# Altium footprint library 7.Connectors&Battary_holders.PcbLib: 133 footprints (part 8 of 9)
Each footprint in its own frame and in the unit in brackets; x right, y up, seen from the top. Pads: shape width x height; smd on the part's side, far side on the other; paste and mask are expansions set on the pad; w line width, h text height; cw(c..) or ccw(c..) is an arc to the next point about the centre after c.
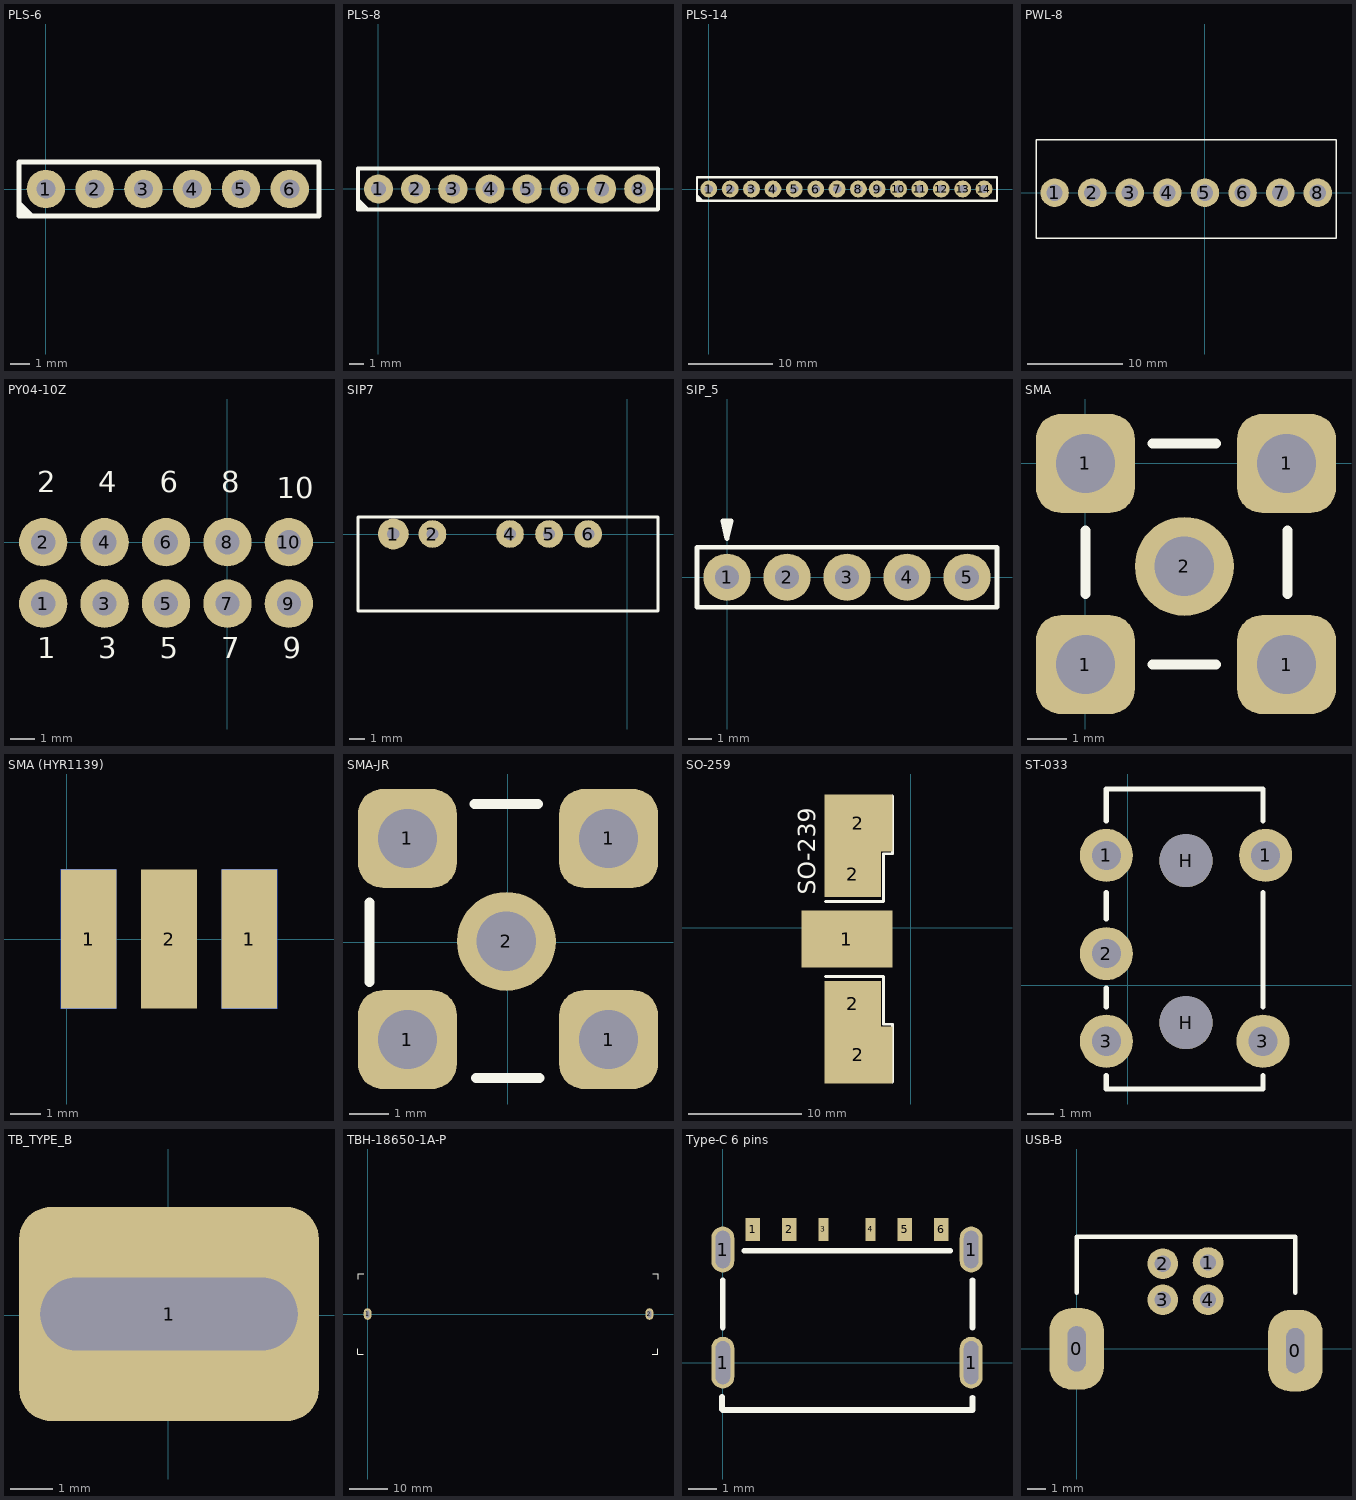
[diagram p7: the footprints below, top view; thin cyan lines are the x and y axes]

## PLS-6 [mm]
pads (6):
  round 2 hole 1: 1(0,0) 2(2.54,0) 3(5.08,0) 4(7.62,0) 5(10.16,0) 6(12.7,0)
Top Overlay:
  lines w0.2: -1.4,-0.7 -0.7,-1.4 -1,-1.4 -1.4,-1 -1.3,-1 -1,-1.3 -0.9,-1.3
  lines w0.254: -1.4,-1.4 14.224,-1.4 14.224,1.4 -1.4,1.4 -1.4,-1.4
3D body "User Library-PLS-5.step": height 8.54, standoff -3, extent -1.2,-1.3 11.5,1.24
3D body "User Library-PLS-5.step": height 8.54, standoff -3, extent 1.34,-1.3 14.04,1.24

## PLS-8 [mm]
pads (8):
  round 2 hole 1: 1(0,0) 2(2.54,0) 3(5.08,0) 4(7.62,0) 5(10.16,0) 6(12.7,0) 7(15.24,0) 8(17.78,0)
Top Overlay:
  lines w0.2: -1.4,-0.7 -0.7,-1.4 -1,-1.4 -1.4,-1 -1.3,-1 -1,-1.3 -0.9,-1.3
  lines w0.254: -1.4,-1.4 -1.4,1.4 19.069,1.4 19.094,1.375 19.094,-1.365 19.059,-1.4 -1.349,-1.4
3D body "User Library-PLS-5.step": height 8.54, standoff -3, extent 6.339,-1.307 19.039,1.233
3D body "User Library-PLS-5.step": height 8.54, standoff -3, extent -1.2,-1.313 11.5,1.227

## PLS-14 [mm]
pads (14):
  round 2 hole 1: 1(0,0) 2(2.54,0) 3(5.08,0) 4(7.62,0) 5(10.16,0) 6(12.7,0) 7(15.24,0) 8(17.78,0) 9(20,0) 10(22.54,0) 11(25.08,0) 12(27.62,0) 13(30.16,0) 14(32.7,0)
Top Overlay:
  lines w0.2: -1.4,-0.7 -0.7,-1.4 -1,-1.4 -1.4,-1 -1.3,-1 -1,-1.3 -0.9,-1.3 ; 19,-1.4 19.3,-1.4
  lines w0.254: 18.6,-1.4 34.246,-1.4 34.246,1.4 18.6,1.4 ; 19.272,-1.4 -1.4,-1.4 -1.4,1.4 19.272,1.4
3D body "User Library-PLS-5.step": height 8.54, standoff -3, extent 8.776,-1.313 21.476,1.227
3D body "User Library-PLS-5.step": height 8.54, standoff -3, extent -1.2,-1.313 11.5,1.227
3D body "User Library-PLS-5.step": height 8.54, standoff -3, extent 21.502,-1.313 34.202,1.227

## PWL-8 [mm]
pads (8):
  round 3 hole 1.7: 1(-15.84,0) 2(-11.88,0) 3(-7.92,0) 4(-3.96,0) 5(0,0) 6(3.96,0) 7(7.92,0) 8(11.88,0)
Top Overlay:
  lines w0.15: -17.8,-4.8 -17.8,5.6 13.8,5.6 13.8,-4.8 -17.8,-4.8
3D body "User Library-PWL-8.step": height 13.8, standoff -3.6, extent -17.8,-4.8 13.88,5.6

## PY04-10Z [mm]
pads (10):
  round 2 hole 1: 1(-7.62,-2.54) 2(-7.62,0) 3(-5.08,-2.54) 4(-5.08,0) 5(-2.54,-2.54) 6(-2.54,0) 7(0,-2.54) 8(0,0) 9(2.54,-2.54) 10(2.54,0)
Top Overlay:
  text "1" at -7.874,-5.08 h1.5
  text "2" at -7.874,1.778 h1.5
  text "10" at 2.032,1.524 h1.5
  text "9" at 2.286,-5.08 h1.5
  text "4" at -5.334,1.778 h1.5
  text "6" at -2.794,1.778 h1.5
  text "8" at -0.254,1.778 h1.5
  text "3" at -5.334,-5.08 h1.5
  text "5" at -2.794,-5.08 h1.5
  text "7" at -0.254,-5.08 h1.5
3D body "User Library-py04-10z.step": height 20, standoff 0, extent -12.032,-21.896 7.968,-6.096

## SIP7 [mm]
pads (5):
  round 2 hole 0.8: 1(-15.2,0)
  round 1.8 hole 0.8: 2(-12.66,0) 4(-7.62,0) 5(-5.08,0) 6(-2.54,0)
Top Overlay:
  lines w0.2: -17.5,-5 -17.5,1.1 2,1.1 2,-5 -17.5,-5
3D body "41356.stp": height 11, standoff -2.4, extent -17.55,-5.05 1.95,1.05

## SIP_5 [mm]
pads (5):
  round 2 hole 1: 1(0,0) 2(2.54,0) 3(5.08,0) 4(7.62,0) 5(10.16,0)
Top Overlay:
  lines w0.2: -0.051,2.311 0,2.007 ; 0,1.626 -0.178,2.388 0.178,2.388 0,1.702 ; -1.27,-1.27 11.43,-1.27 11.43,1.27 -1.27,1.27 -1.27,-1.27
3D body "User Library-SOCKET, SIP5, P2_54MM,  L6MM.step": height 4, standoff -6.2, extent -1.27,-1.27 11.43,1.27

## SMA [mm]
pads (5):
  rrect50% 2.5x2.5 hole 1.5 mask+0.102: 1(0,-5.08) 1(0,0) 1(5.08,-5.08) 1(5.08,0)
  round 2.5 hole 1.5: 2(2.5,-2.6)
Top Overlay:
  lines w0.254: 0,-3.3 0,-1.7 ; 1.7,-5.08 3.3,-5.08 ; 1.7,0.5 3.3,0.5 ; 5.1,-3.3 5.1,-1.7
3D body "User Library-SMA_Stehend_Amp 132134RP-1.STEP": height 9.53, standoff -3.94, extent -1,-6.1 6,0.9

## SMA (HYR1139) [mm]
pads (5):
  rect 1.8x4.5 smd far side: 1(0.7,0) 1(5.9,0)
  rect 1.8x4.5 smd: 1(0.7,0) 1(5.9,0) 2(3.3,0)
3D body "User Library-620-SMA-02-112-TGG SMA Female for PCB edge Mount.step": height 3.5, standoff -2.55, extent 0.225,-12 6.225,1.6

## SMA-JR [mm]
pads (5):
  rrect50% 2.5x2.5 hole 1.5: 1(-2.536,-2.457) 1(-2.536,2.623) 1(2.544,-2.457) 1(2.544,2.623)
  round 2.5 hole 1.5: 2(-0.036,0.023)
Top Overlay:
  lines w0.254: -3.5,-1 -3.5,1 ; -0.836,3.488 0.764,3.488 ; -0.804,-3.432 0.796,-3.432
3D body "User Library-901-143-6RFX.step": height 9.86, standoff -3.94, extent -3.597,-3.525 11.503,3.475

## SO-259 [mm]
pads (5):
  rect 8x5 smd: 1(-5.6,-1)
  rect 5x4 smd: 2(-5.1,-6.7) 2(-5.1,4.7)
  rect 6x5 smd: 2(-4.6,-11.2) 2(-4.6,9.2)
Top Overlay:
  lines w0.254: -7.5,-4.3 -2.4,-4.3 -2.4,-8.5 -1.6,-8.5 -1.6,-13.6 ; -7.5,2.3 -2.4,2.3 -2.4,6.5 -1.6,6.5 -1.6,11.6
  text "SO-239" at -8.4,2.9 h1.52
3D body "pl-259_jack.stp": height 14.4, standoff -11, extent -7.6,-13.7 19.2,11.7

## ST-033 [mm]
pads (7):
  round 2 hole 1.1: 1(-0.8,4.9) 1(5.2,4.9) 2(-0.8,1.2) 3(-0.8,-2.1) 3(5.1,-2.1)
  round 2 hole 2: H(2.2,-1.4) H(2.2,4.7)
Top Overlay:
  lines w0.2: -0.8,-3.4 -0.8,-3.9 5.1,-3.9 5.1,-3.4 ; -0.8,-0.8 -0.8,-0.1 ; -0.8,2.5 -0.8,3.5 ; -0.8,6.2 -0.8,7.4 5.1,7.4 5.1,6.2 ; 5.1,-0.8 5.1,-0.1 5.1,3.5
3D body "User Library-Jack Audio 3_5 Female.STEP": height 5.22, standoff -2.79, extent -1.2,-6.4 5.386,7.6

## TB_TYPE_B [mm]
pads (1):
  rrect30% 7x5 hole 1.7 slot 6 at 0 deg mask+0: 1(0.018,0.035)
Top Solder:
  rectangle: -2.346,-2.473 2.376,2.544
Bottom Solder:
  rectangle: -2.347,-2.472 2.376,2.545
3D body "PCB_TB_B.STEP": height 6, standoff -2.5, extent -2.508,-2.463 2.492,2.537

## TBH-18650-1A-P [mm]
pads (2):
  oval 2x3 hole 0.8 slot 1.8 at 90 deg: 1(0,0) 2(72.9,0)
Top Overlay:
  lines w0.15: -2.485,-8.949 -2.485,-10.349 -1.085,-10.349 ; -2.449,8.985 -2.449,10.385 -1.049,10.385 ; 73.649,-10.385 75.049,-10.385 75.049,-8.985 ; 73.7,10.4 75.1,10.4 75.1,9
3D body "User Library-18650 Full.STEP": height 21.65, standoff -3.83, extent -2.515,-10.4 75.135,10.4

## Type-C 6 pins [mm]
pads (10):
  oval 0.8x1.8 hole 0.5 slot 1.5 at 90 deg: 1(0,0) 1(8.65,0)
  oval 0.8x1.6 hole 0.5 slot 1.3 at 90 deg: 1(0,3.94) 1(8.65,3.94)
  rect 0.5x0.8 smd: 1(1.045,4.64) 2(2.315,4.64) 5(6.335,4.64) 6(7.605,4.64)
  rect 0.35x0.8 smd: 3(3.5,4.64) 4(5.15,4.64)
Top Overlay:
  lines w0.2: -0.025,-1.2 -0.025,-1.625 0,-1.65 8.7,-1.65 8.7,-1.225 ; 0,1.225 0,2.875 ; 0.75,3.9 7.925,3.9 ; 8.7,1.225 8.7,2.875
3D body "User Library-USB_Type_C_6pin.step": height 3.44, standoff -0.79, extent -0.154,-2.5 8.786,4.3

## USB-B [mm]
pads (6):
  rrect80% 3x4.5 hole 1 slot 2.5 at 90 deg: 0(0,0) 0(12.1,-0.1)
  round 1.7 hole 0.9: 1(7.27,4.77) 2(4.77,4.71) 3(4.77,2.71) 4(7.27,2.71)
Top Overlay:
  lines w0.25: 0,3.1 0,6.2 12.1,6.2 12.1,3.1
3D body "User Library-Samtec - USB-B-S-X-W-TH.STEP": height 11, standoff -3.64, extent -1.4,-10.3 13.398,6.2